# Altium footprint library FootprintSMD.PcbLib: 140 footprints (part 4 of 9)
Each footprint in its own frame and in the unit in brackets; x right, y up, seen from the top. Pads: shape width x height; smd on the part's side, far side on the other; paste and mask are expansions set on the pad; w line width, h text height; cw(c..) or ccw(c..) is an arc to the next point about the centre after c.
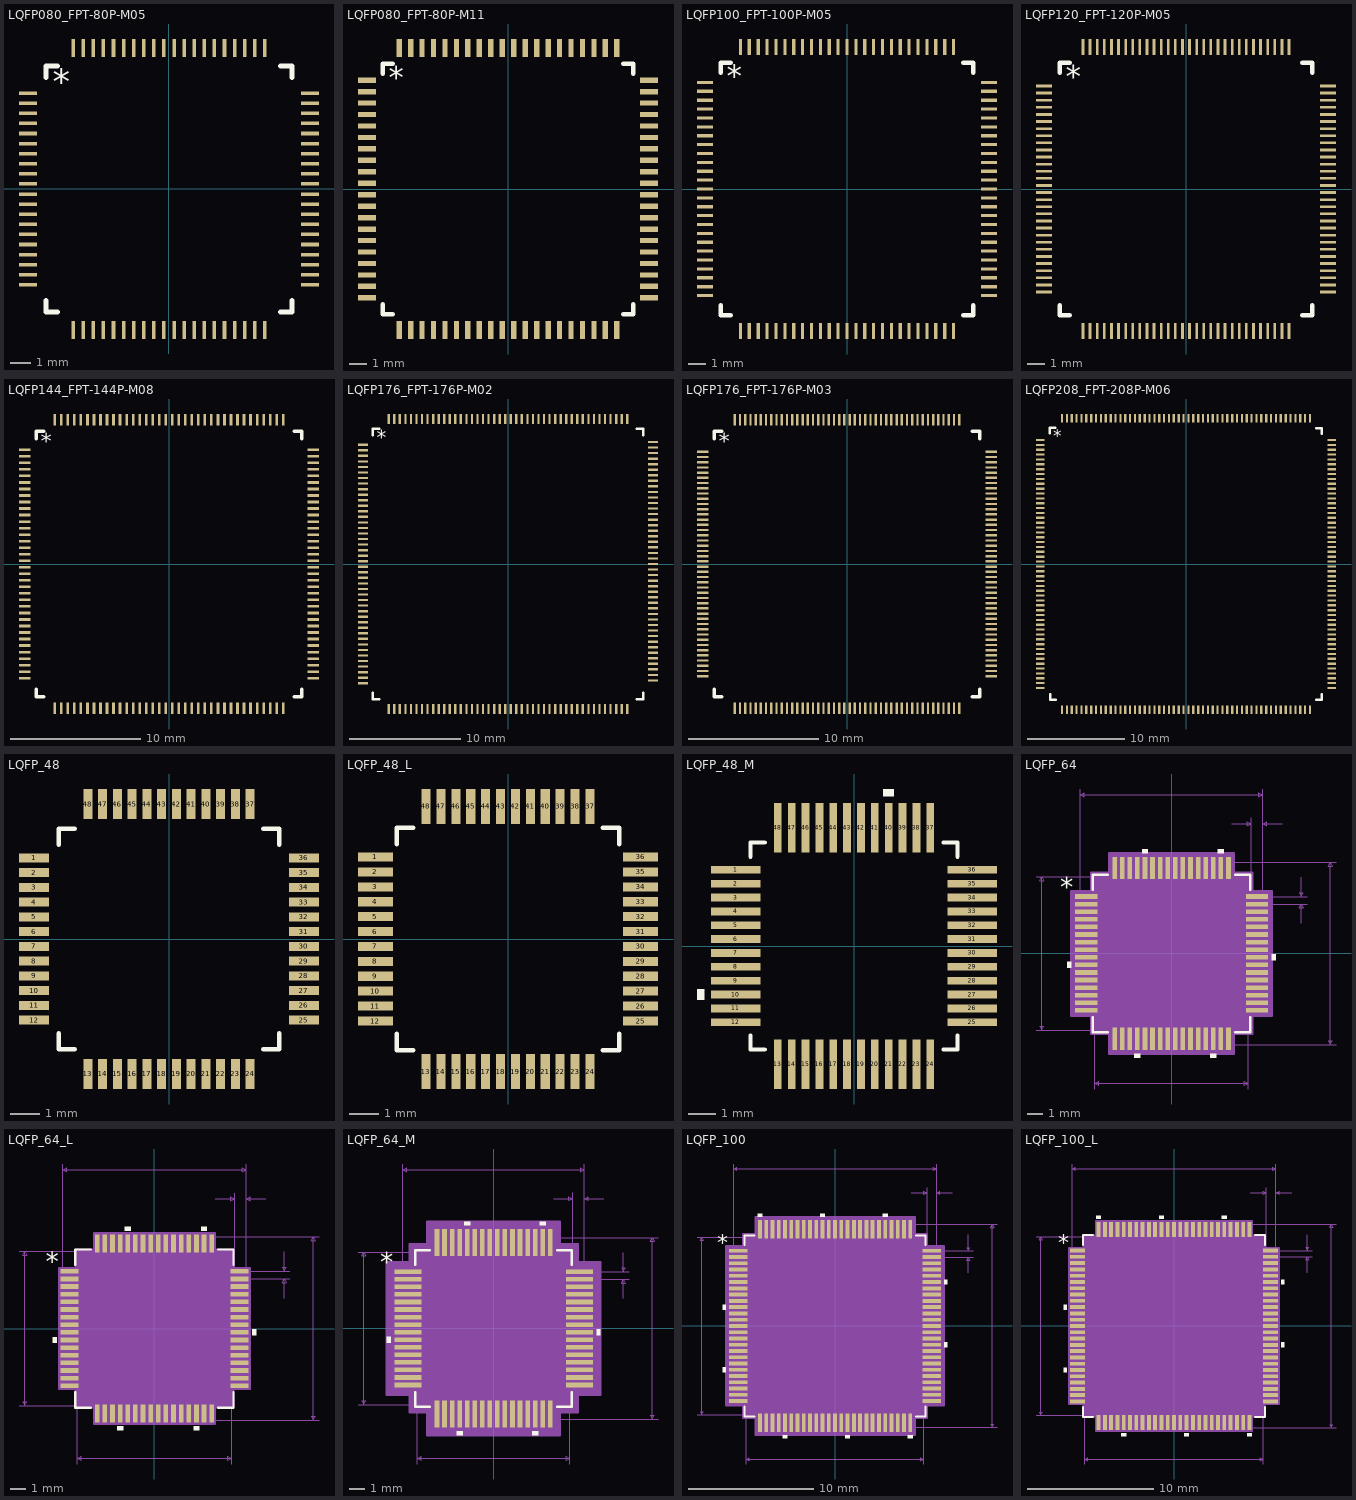
[diagram p3: the footprints below, top view; thin cyan lines are the x and y axes]

## LQFP080_FPT-80P-M05 [mil]
pads (80):
  rect 35x7 smd: 1(-275,187.01) 2(-275,167.32) 3(-275,147.64) 4(-275,127.95) 5(-275,108.27) 6(-275,88.58) 7(-275,68.9) 8(-275,49.21) 9(-275,29.53) 10(-275,9.84) 11(-275,-9.84) 12(-275,-29.53) 13(-275,-49.21) 14(-275,-68.9) 15(-275,-88.58) 16(-275,-108.27) 17(-275,-127.95) 18(-275,-147.64) 19(-275,-167.32) 20(-275,-187.01) 41(275,-187.01) 42(275,-167.32) 43(275,-147.64) 44(275,-127.95) 45(275,-108.27) 46(275,-88.58) 47(275,-68.9) 48(275,-49.21) 49(275,-29.53) 50(275,-9.84) 51(275,9.84) 52(275,29.53) 53(275,49.21) 54(275,68.9) 55(275,88.58) 56(275,108.27) 57(275,127.95) 58(275,147.64) 59(275,167.32) 60(275,187.01)
  rect 7x35 smd: 21(-187.01,-275) 22(-167.32,-275) 23(-147.64,-275) 24(-127.95,-275) 25(-108.27,-275) 26(-88.58,-275) 27(-68.9,-275) 28(-49.21,-275) 29(-29.53,-275) 30(-9.84,-275) 31(9.84,-275) 32(29.53,-275) 33(49.21,-275) 34(68.9,-275) 35(88.58,-275) 36(108.27,-275) 37(127.95,-275) 38(147.64,-275) 39(167.32,-275) 40(187.01,-275) 61(187.01,275) 62(167.32,275) 63(147.64,275) 64(127.95,275) 65(108.27,275) 66(88.58,275) 67(68.9,275) 68(49.21,275) 69(29.53,275) 70(9.84,275) 71(-9.84,275) 72(-29.53,275) 73(-49.21,275) 74(-68.9,275) 75(-88.58,275) 76(-108.27,275) 77(-127.95,275) 78(-147.64,275) 79(-167.32,275) 80(-187.01,275)
Top Overlay:
  lines w10: -240,-217.87 -240,-240 -217.87,-240 ; -240,217.87 -240,240 -217.87,240 ; 217.87,-240 240,-240 240,-217.87 ; 217.87,240 240,240 240,217.87
  text "*" at -226.66,185.01 h50
3D body "LQFP80_FPT-80P-M05.stp": height 59.06, standoff 0, extent -275.58,-275.59 275.6,275.59

## LQFP080_FPT-80P-M11 [mil]
pads (80):
  rect 40x12 smd: 1(-315,243.11) 2(-315,217.52) 3(-315,191.93) 4(-315,166.34) 5(-315,140.75) 6(-315,115.16) 7(-315,89.57) 8(-315,63.98) 9(-315,38.39) 10(-315,12.8) 11(-315,-12.8) 12(-315,-38.39) 13(-315,-63.98) 14(-315,-89.57) 15(-315,-115.16) 16(-315,-140.75) 17(-315,-166.34) 18(-315,-191.93) 19(-315,-217.52) 20(-315,-243.11) 41(315,-243.11) 42(315,-217.52) 43(315,-191.93) 44(315,-166.34) 45(315,-140.75) 46(315,-115.16) 47(315,-89.57) 48(315,-63.98) 49(315,-38.39) 50(315,-12.8) 51(315,12.8) 52(315,38.39) 53(315,63.98) 54(315,89.57) 55(315,115.16) 56(315,140.75) 57(315,166.34) 58(315,191.93) 59(315,217.52) 60(315,243.11)
  rect 12x40 smd: 21(-243.11,-315) 22(-217.52,-315) 23(-191.93,-315) 24(-166.34,-315) 25(-140.75,-315) 26(-115.16,-315) 27(-89.57,-315) 28(-63.98,-315) 29(-38.39,-315) 30(-12.8,-315) 31(12.8,-315) 32(38.39,-315) 33(63.98,-315) 34(89.57,-315) 35(115.16,-315) 36(140.75,-315) 37(166.34,-315) 38(191.93,-315) 39(217.52,-315) 40(243.11,-315) 61(243.11,315) 62(217.52,315) 63(191.93,315) 64(166.34,315) 65(140.75,315) 66(115.16,315) 67(89.57,315) 68(63.98,315) 69(38.39,315) 70(12.8,315) 71(-12.8,315) 72(-38.39,315) 73(-63.98,315) 74(-89.57,315) 75(-115.16,315) 76(-140.75,315) 77(-166.34,315) 78(-191.93,315) 79(-217.52,315) 80(-243.11,315)
Top Overlay:
  lines w10: -280,-257.87 -280,-280 -257.87,-280 ; -280,257.87 -280,280 -257.87,280 ; 257.87,-280 280,-280 280,-257.87 ; 257.87,280 280,280 280,257.87
  text "*" at -266.66,225.01 h50
3D body "LQFP80_FPT-80P-M11.stp": height 59.06, standoff 0, extent -314.95,-314.96 314.97,314.96

## LQFP100_FPT-100P-M05 [mil]
pads (100):
  rect 35x7 smd: 1(-315,236.22) 2(-315,216.54) 3(-315,196.85) 4(-315,177.17) 5(-315,157.48) 6(-315,137.8) 7(-315,118.11) 8(-315,98.43) 9(-315,78.74) 10(-315,59.06) 11(-315,39.37) 12(-315,19.68) 13(-315,0) 14(-315,-19.69) 15(-315,-39.37) 16(-315,-59.06) 17(-315,-78.74) 18(-315,-98.43) 19(-315,-118.11) 20(-315,-137.8) 21(-315,-157.48) 22(-315,-177.17) 23(-315,-196.85) 24(-315,-216.54) 25(-315,-236.22) 51(315,-236.22) 52(315,-216.54) 53(315,-196.85) 54(315,-177.17) 55(315,-157.48) 56(315,-137.8) 57(315,-118.11) 58(315,-98.43) 59(315,-78.74) 60(315,-59.06) 61(315,-39.37) 62(315,-19.69) 63(315,0) 64(315,19.68) 65(315,39.37) 66(315,59.06) 67(315,78.74) 68(315,98.43) 69(315,118.11) 70(315,137.8) 71(315,157.48) 72(315,177.17) 73(315,196.85) 74(315,216.54) 75(315,236.22)
  rect 7x35 smd: 26(-236.22,-315) 27(-216.54,-315) 28(-196.85,-315) 29(-177.17,-315) 30(-157.48,-315) 31(-137.8,-315) 32(-118.11,-315) 33(-98.43,-315) 34(-78.74,-315) 35(-59.06,-315) 36(-39.37,-315) 37(-19.69,-315) 38(0,-315) 39(19.68,-315) 40(39.37,-315) 41(59.06,-315) 42(78.74,-315) 43(98.43,-315) 44(118.11,-315) 45(137.8,-315) 46(157.48,-315) 47(177.17,-315) 48(196.85,-315) 49(216.54,-315) 50(236.22,-315) 76(236.22,315) 77(216.54,315) 78(196.85,315) 79(177.17,315) 80(157.48,315) 81(137.8,315) 82(118.11,315) 83(98.43,315) 84(78.74,315) 85(59.06,315) 86(39.37,315) 87(19.68,315) 88(0,315) 89(-19.69,315) 90(-39.37,315) 91(-59.06,315) 92(-78.74,315) 93(-98.43,315) 94(-118.11,315) 95(-137.8,315) 96(-157.48,315) 97(-177.17,315) 98(-196.85,315) 99(-216.54,315) 100(-236.22,315)
Top Overlay:
  lines w10: -280,-257.87 -280,-280 -257.87,-280 ; -280,257.87 -280,280 -257.87,280 ; 257.87,-280 280,-280 280,-257.87 ; 257.87,280 280,280 280,257.87
  text "*" at -266.66,225.01 h50
3D body "LQFP100_FPT-100P-M05.stp": height 59.06, standoff 0, extent -320,-309.92 309.92,320

## LQFP120_FPT-120P-M05 [mil]
pads (120):
  rect 35x6 smd: 1(-315,228.35) 2(-315,212.6) 3(-315,196.85) 4(-315,181.1) 5(-315,165.35) 6(-315,149.61) 7(-315,133.86) 8(-315,118.11) 9(-315,102.36) 10(-315,86.61) 11(-315,70.87) 12(-315,55.12) 13(-315,39.37) 14(-315,23.62) 15(-315,7.87) 16(-315,-7.87) 17(-315,-23.62) 18(-315,-39.37) 19(-315,-55.12) 20(-315,-70.87) 21(-315,-86.61) 22(-315,-102.36) 23(-315,-118.11) 24(-315,-133.86) 25(-315,-149.61) 26(-315,-165.35) 27(-315,-181.1) 28(-315,-196.85) 29(-315,-212.6) 30(-315,-228.35) 61(315,-228.35) 62(315,-212.6) 63(315,-196.85) 64(315,-181.1) 65(315,-165.35) 66(315,-149.61) 67(315,-133.86) 68(315,-118.11) 69(315,-102.36) 70(315,-86.61) 71(315,-70.87) 72(315,-55.12) 73(315,-39.37) 74(315,-23.62) 75(315,-7.87) 76(315,7.87) 77(315,23.62) 78(315,39.37) 79(315,55.12) 80(315,70.87) 81(315,86.61) 82(315,102.36) 83(315,118.11) 84(315,133.86) 85(315,149.61) 86(315,165.35) 87(315,181.1) 88(315,196.85) 89(315,212.6) 90(315,228.35)
  rect 6x35 smd: 31(-228.35,-315) 32(-212.6,-315) 33(-196.85,-315) 34(-181.1,-315) 35(-165.35,-315) 36(-149.61,-315) 37(-133.86,-315) 38(-118.11,-315) 39(-102.36,-315) 40(-86.61,-315) 41(-70.87,-315) 42(-55.12,-315) 43(-39.37,-315) 44(-23.62,-315) 45(-7.87,-315) 46(7.87,-315) 47(23.62,-315) 48(39.37,-315) 49(55.12,-315) 50(70.87,-315) 51(86.61,-315) 52(102.36,-315) 53(118.11,-315) 54(133.86,-315) 55(149.61,-315) 56(165.35,-315) 57(181.1,-315) 58(196.85,-315) 59(212.6,-315) 60(228.35,-315) 91(228.34,315) 92(212.59,315) 93(196.84,315) 94(181.1,315) 95(165.35,315) 96(149.6,315) 97(133.85,315) 98(118.1,315) 99(102.36,315) 100(86.61,315) 101(70.86,315) 102(55.11,315) 103(39.36,315) 104(23.62,315) 105(7.87,315) 106(-7.88,315) 107(-23.63,315) 108(-39.38,315) 109(-55.12,315) 110(-70.87,315) 111(-86.62,315) 112(-102.37,315) 113(-118.12,315) 114(-133.87,315) 115(-149.61,315) 116(-165.36,315) 117(-181.11,315) 118(-196.86,315) 119(-212.61,315) 120(-228.35,315)
Top Overlay:
  lines w10: -280,-257.87 -280,-280 -257.87,-280 ; -280,257.87 -280,280 -257.87,280 ; 257.87,-280 280,-280 280,-257.87 ; 257.87,280 280,280 280,257.87
  text "*" at -266.86,224.98 h50
3D body "LQFP120_FPT-120P-M05.stp": height 59.06, standoff 0, extent -314.95,-314.96 314.97,314.96

## LQFP144_FPT-144P-M08 [mil]
pads (144):
  rect 35x8 smd: 1(-435,344.49) 2(-435,324.8) 3(-435,305.12) 4(-435,285.43) 5(-435,265.75) 6(-435,246.06) 7(-435,226.38) 8(-435,206.69) 9(-435,187.01) 10(-435,167.32) 11(-435,147.64) 12(-435,127.95) 13(-435,108.27) 14(-435,88.58) 15(-435,68.9) 16(-435,49.21) 17(-435,29.53) 18(-435,9.84) 19(-435,-9.84) 20(-435,-29.53) 21(-435,-49.21) 22(-435,-68.9) 23(-435,-88.58) 24(-435,-108.27) 25(-435,-127.95) 26(-435,-147.64) 27(-435,-167.32) 28(-435,-187.01) 29(-435,-206.69) 30(-435,-226.38) 31(-435,-246.06) 32(-435,-265.75) 33(-435,-285.43) 34(-435,-305.12) 35(-435,-324.8) 36(-435,-344.49) 73(435,-344.49) 74(435,-324.8) 75(435,-305.12) 76(435,-285.43) 77(435,-265.75) 78(435,-246.06) 79(435,-226.38) 80(435,-206.69) 81(435,-187.01) 82(435,-167.32) 83(435,-147.64) 84(435,-127.95) 85(435,-108.27) 86(435,-88.58) 87(435,-68.9) 88(435,-49.21) 89(435,-29.53) 90(435,-9.84) 91(435,9.84) 92(435,29.53) 93(435,49.21) 94(435,68.9) 95(435,88.58) 96(435,108.27) 97(435,127.95) 98(435,147.64) 99(435,167.32) 100(435,187.01) 101(435,206.69) 102(435,226.38) 103(435,246.06) 104(435,265.75) 105(435,285.43) 106(435,305.12) 107(435,324.8) 108(435,344.49)
  rect 8x35 smd: 37(-344.49,-435) 38(-324.8,-435) 39(-305.12,-435) 40(-285.43,-435) 41(-265.75,-435) 42(-246.06,-435) 43(-226.38,-435) 44(-206.69,-435) 45(-187.01,-435) 46(-167.32,-435) 47(-147.64,-435) 48(-127.95,-435) 49(-108.27,-435) 50(-88.58,-435) 51(-68.9,-435) 52(-49.21,-435) 53(-29.53,-435) 54(-9.84,-435) 55(9.84,-435) 56(29.53,-435) 57(49.21,-435) 58(68.9,-435) 59(88.58,-435) 60(108.27,-435) 61(127.95,-435) 62(147.64,-435) 63(167.32,-435) 64(187.01,-435) 65(206.69,-435) 66(226.38,-435) 67(246.06,-435) 68(265.75,-435) 69(285.43,-435) 70(305.12,-435) 71(324.8,-435) 72(344.49,-435) 109(344.49,435) 110(324.8,435) 111(305.12,435) 112(285.43,435) 113(265.75,435) 114(246.06,435) 115(226.38,435) 116(206.69,435) 117(187.01,435) 118(167.32,435) 119(147.64,435) 120(127.95,435) 121(108.27,435) 122(88.58,435) 123(68.9,435) 124(49.21,435) 125(29.53,435) 126(9.84,435) 127(-9.84,435) 128(-29.53,435) 129(-49.21,435) 130(-68.9,435) 131(-88.58,435) 132(-108.27,435) 133(-127.95,435) 134(-147.64,435) 135(-167.32,435) 136(-187.01,435) 137(-206.69,435) 138(-226.38,435) 139(-246.06,435) 140(-265.75,435) 141(-285.43,435) 142(-305.12,435) 143(-324.8,435) 144(-344.49,435)
Top Overlay:
  lines w10: -400,-377.87 -400,-400 -377.87,-400 ; -400,377.87 -400,400 -377.87,400 ; 377.87,-400 400,-400 400,-377.87 ; 377.87,400 400,400 400,377.87
  text "*" at -386.86,344.98 h50
3D body "LQFP144_FPT-144P-M08.stp": height 66.93, standoff 0, extent -433.06,-433.07 433.08,433.07

## LQFP176_FPT-176P-M02 [mil]
pads (176):
  rect 35x8 smd: 1(-515,423.23) 2(-515,403.54) 3(-515,383.86) 4(-515,364.17) 5(-515,344.49) 6(-515,324.8) 7(-515,305.12) 8(-515,285.43) 9(-515,265.75) 10(-515,246.06) 11(-515,226.38) 12(-515,206.69) 13(-515,187.01) 14(-515,167.32) 15(-515,147.64) 16(-515,127.95) 17(-515,108.27) 18(-515,88.58) 19(-515,68.9) 20(-515,49.21) 21(-515,29.53) 22(-515,9.84) 23(-515,-9.84) 24(-515,-29.53) 25(-515,-49.21) 26(-515,-68.9) 27(-515,-88.58) 28(-515,-108.27) 29(-515,-127.95) 30(-515,-147.64) 31(-515,-167.32) 32(-515,-187.01) 33(-515,-206.69) 34(-515,-226.38) 35(-515,-246.06) 36(-515,-265.75) 37(-515,-285.43) 38(-515,-305.12) 39(-515,-324.8) 40(-515,-344.49) 41(-515,-364.17) 42(-515,-383.86) 43(-515,-403.54) 44(-515,-423.23) 89(515,-413.39) 90(515,-393.7) 91(515,-374.02) 92(515,-354.33) 93(515,-334.65) 94(515,-314.96) 95(515,-295.28) 96(515,-275.59) 97(515,-255.91) 98(515,-236.22) 99(515,-216.54) 100(515,-196.85) 101(515,-177.17) 102(515,-157.48) 103(515,-137.8) 104(515,-118.11) 105(515,-98.43) 106(515,-78.74) 107(515,-59.05) 108(515,-39.37) 109(515,-19.68) 110(515,0) 111(515,19.69) 112(515,39.37) 113(515,59.06) 114(515,78.74) 115(515,98.43) 116(515,118.11) 117(515,137.8) 118(515,157.48) 119(515,177.17) 120(515,196.85) 121(515,216.54) 122(515,236.22) 123(515,255.91) 124(515,275.59) 125(515,295.28) 126(515,314.96) 127(515,334.65) 128(515,354.33) 129(515,374.02) 130(515,393.7) 131(515,413.39) 132(515,433.07)
  rect 8x35 smd: 45(-423.23,-515) 46(-403.54,-515) 47(-383.86,-515) 48(-364.17,-515) 49(-344.49,-515) 50(-324.8,-515) 51(-305.12,-515) 52(-285.43,-515) 53(-265.75,-515) 54(-246.06,-515) 55(-226.38,-515) 56(-206.69,-515) 57(-187.01,-515) 58(-167.32,-515) 59(-147.64,-515) 60(-127.95,-515) 61(-108.27,-515) 62(-88.58,-515) 63(-68.9,-515) 64(-49.21,-515) 65(-29.53,-515) 66(-9.84,-515) 67(9.84,-515) 68(29.53,-515) 69(49.21,-515) 70(68.9,-515) 71(88.58,-515) 72(108.27,-515) 73(127.95,-515) 74(147.64,-515) 75(167.32,-515) 76(187.01,-515) 77(206.69,-515) 78(226.38,-515) 79(246.06,-515) 80(265.75,-515) 81(285.43,-515) 82(305.12,-515) 83(324.8,-515) 84(344.49,-515) 85(364.17,-515) 86(383.86,-515) 87(403.54,-515) 88(423.23,-515) 133(423.23,515) 134(403.54,515) 135(383.86,515) 136(364.17,515) 137(344.49,515) 138(324.8,515) 139(305.12,515) 140(285.43,515) 141(265.75,515) 142(246.06,515) 143(226.38,515) 144(206.69,515) 145(187.01,515) 146(167.32,515) 147(147.64,515) 148(127.95,515) 149(108.27,515) 150(88.58,515) 151(68.9,515) 152(49.21,515) 153(29.53,515) 154(9.84,515) 155(-9.84,515) 156(-29.53,515) 157(-49.21,515) 158(-68.9,515) 159(-88.58,515) 160(-108.27,515) 161(-127.95,515) 162(-147.64,515) 163(-167.32,515) 164(-187.01,515) 165(-206.69,515) 166(-226.38,515) 167(-246.06,515) 168(-265.75,515) 169(-285.43,515) 170(-305.12,515) 171(-324.8,515) 172(-344.49,515) 173(-364.17,515) 174(-383.86,515) 175(-403.54,515) 176(-423.23,515)
Top Overlay:
  lines w10: -480,-457.87 -480,-480 -457.87,-480 ; -480,457.87 -480,480 -457.87,480 ; 457.87,-480 480,-480 480,-457.87 ; 457.87,480 480,480 480,457.87
  text "*" at -466.66,425.01 h50
3D body "LQFP176_FPT-176P-M02.stp": height 59.06, standoff 0, extent -511.8,-511.81 511.82,511.81

## LQFP176_FPT-176P-M03 [mil]
pads (176):
  rect 35x7 smd: 1(-435,338.58) 2(-435,322.83) 3(-435,307.09) 4(-435,291.34) 5(-435,275.59) 6(-435,259.84) 7(-435,244.09) 8(-435,228.35) 9(-435,212.6) 10(-435,196.85) 11(-435,181.1) 12(-435,165.35) 13(-435,149.61) 14(-435,133.86) 15(-435,118.11) 16(-435,102.36) 17(-435,86.61) 18(-435,70.87) 19(-435,55.12) 20(-435,39.37) 21(-435,23.62) 22(-435,7.87) 23(-435,-7.87) 24(-435,-23.62) 25(-435,-39.37) 26(-435,-55.12) 27(-435,-70.87) 28(-435,-86.61) 29(-435,-102.36) 30(-435,-118.11) 31(-435,-133.86) 32(-435,-149.61) 33(-435,-165.35) 34(-435,-181.1) 35(-435,-196.85) 36(-435,-212.6) 37(-435,-228.35) 38(-435,-244.09) 39(-435,-259.84) 40(-435,-275.59) 41(-435,-291.34) 42(-435,-307.09) 43(-435,-322.83) 44(-435,-338.58) 89(435,-338.58) 90(435,-322.83) 91(435,-307.09) 92(435,-291.34) 93(435,-275.59) 94(435,-259.84) 95(435,-244.09) 96(435,-228.35) 97(435,-212.6) 98(435,-196.85) 99(435,-181.1) 100(435,-165.35) 101(435,-149.61) 102(435,-133.86) 103(435,-118.11) 104(435,-102.36) 105(435,-86.61) 106(435,-70.87) 107(435,-55.12) 108(435,-39.37) 109(435,-23.62) 110(435,-7.87) 111(435,7.87) 112(435,23.62) 113(435,39.37) 114(435,55.12) 115(435,70.87) 116(435,86.61) 117(435,102.36) 118(435,118.11) 119(435,133.86) 120(435,149.61) 121(435,165.35) 122(435,181.1) 123(435,196.85) 124(435,212.6) 125(435,228.35) 126(435,244.09) 127(435,259.84) 128(435,275.59) 129(435,291.34) 130(435,307.09) 131(435,322.83) 132(435,338.58)
  rect 7x35 smd: 45(-338.58,-435) 46(-322.83,-435) 47(-307.09,-435) 48(-291.34,-435) 49(-275.59,-435) 50(-259.84,-435) 51(-244.09,-435) 52(-228.35,-435) 53(-212.6,-435) 54(-196.85,-435) 55(-181.1,-435) 56(-165.35,-435) 57(-149.61,-435) 58(-133.86,-435) 59(-118.11,-435) 60(-102.36,-435) 61(-86.61,-435) 62(-70.87,-435) 63(-55.12,-435) 64(-39.37,-435) 65(-23.62,-435) 66(-7.87,-435) 67(7.87,-435) 68(23.62,-435) 69(39.37,-435) 70(55.12,-435) 71(70.87,-435) 72(86.61,-435) 73(102.36,-435) 74(118.11,-435) 75(133.86,-435) 76(149.61,-435) 77(165.35,-435) 78(181.1,-435) 79(196.85,-435) 80(212.6,-435) 81(228.35,-435) 82(244.09,-435) 83(259.84,-435) 84(275.59,-435) 85(291.34,-435) 86(307.09,-435) 87(322.83,-435) 88(338.58,-435) 133(338.58,435) 134(322.83,435) 135(307.09,435) 136(291.34,435) 137(275.59,435) 138(259.84,435) 139(244.09,435) 140(228.35,435) 141(212.6,435) 142(196.85,435) 143(181.1,435) 144(165.35,435) 145(149.61,435) 146(133.86,435) 147(118.11,435) 148(102.36,435) 149(86.61,435) 150(70.87,435) 151(55.12,435) 152(39.37,435) 153(23.62,435) 154(7.87,435) 155(-7.87,435) 156(-23.62,435) 157(-39.37,435) 158(-55.12,435) 159(-70.87,435) 160(-86.61,435) 161(-102.36,435) 162(-118.11,435) 163(-133.86,435) 164(-149.61,435) 165(-165.35,435) 166(-181.1,435) 167(-196.85,435) 168(-212.6,435) 169(-228.35,435) 170(-244.09,435) 171(-259.84,435) 172(-275.59,435) 173(-291.34,435) 174(-307.09,435) 175(-322.83,435) 176(-338.58,435)
Top Overlay:
  lines w10: -400,-377.87 -400,-400 -377.87,-400 ; -400,377.87 -400,400 -377.87,400 ; 377.87,-400 400,-400 400,-377.87 ; 377.87,400 400,400 400,377.87
  text "*" at -386.66,345.01 h50
3D body "LQFP176_FPT-176P-M03.stp": height 66.93, standoff 0, extent -433.07,-433.07 433.08,433.07

## LQFP208_FPT-208P-M06 [mil]
pads (208):
  rect 35x9 smd: 1(-590,501.97) 2(-590,482.28) 3(-590,462.6) 4(-590,442.91) 5(-590,423.23) 6(-590,403.54) 7(-590,383.86) 8(-590,364.17) 9(-590,344.49) 10(-590,324.8) 11(-590,305.12) 12(-590,285.43) 13(-590,265.75) 14(-590,246.06) 15(-590,226.38) 16(-590,206.69) 17(-590,187.01) 18(-590,167.32) 19(-590,147.64) 20(-590,127.95) 21(-590,108.27) 22(-590,88.58) 23(-590,68.9) 24(-590,49.21) 25(-590,29.53) 26(-590,9.84) 27(-590,-9.84) 28(-590,-29.53) 29(-590,-49.21) 30(-590,-68.9) 31(-590,-88.58) 32(-590,-108.27) 33(-590,-127.95) 34(-590,-147.64) 35(-590,-167.32) 36(-590,-187.01) 37(-590,-206.69) 38(-590,-226.38) 39(-590,-246.06) 40(-590,-265.75) 41(-590,-285.43) 42(-590,-305.12) 43(-590,-324.8) 44(-590,-344.49) 45(-590,-364.17) 46(-590,-383.86) 47(-590,-403.54) 48(-590,-423.23) 49(-590,-442.91) 50(-590,-462.6) 51(-590,-482.28) 52(-590,-501.97) 105(590,-501.97) 106(590,-482.28) 107(590,-462.6) 108(590,-442.91) 109(590,-423.23) 110(590,-403.54) 111(590,-383.86) 112(590,-364.17) 113(590,-344.49) 114(590,-324.8) 115(590,-305.12) 116(590,-285.43) 117(590,-265.75) 118(590,-246.06) 119(590,-226.38) 120(590,-206.69) 121(590,-187.01) 122(590,-167.32) 123(590,-147.64) 124(590,-127.95) 125(590,-108.27) 126(590,-88.58) 127(590,-68.9) 128(590,-49.21) 129(590,-29.53) 130(590,-9.84) 131(590,9.84) 132(590,29.53) 133(590,49.21) 134(590,68.9) 135(590,88.58) 136(590,108.27) 137(590,127.95) 138(590,147.64) 139(590,167.32) 140(590,187.01) 141(590,206.69) 142(590,226.38) 143(590,246.06) 144(590,265.75) 145(590,285.43) 146(590,305.12) 147(590,324.8) 148(590,344.49) 149(590,364.17) 150(590,383.86) 151(590,403.54) 152(590,423.23) 153(590,442.91) 154(590,462.6) 155(590,482.28) 156(590,501.97)
  rect 9x35 smd: 53(-501.97,-590) 54(-482.28,-590) 55(-462.6,-590) 56(-442.91,-590) 57(-423.23,-590) 58(-403.54,-590) 59(-383.86,-590) 60(-364.17,-590) 61(-344.49,-590) 62(-324.8,-590) 63(-305.12,-590) 64(-285.43,-590) 65(-265.75,-590) 66(-246.06,-590) 67(-226.38,-590) 68(-206.69,-590) 69(-187.01,-590) 70(-167.32,-590) 71(-147.64,-590) 72(-127.95,-590) 73(-108.27,-590) 74(-88.58,-590) 75(-68.9,-590) 76(-49.21,-590) 77(-29.53,-590) 78(-9.84,-590) 79(9.84,-590) 80(29.53,-590) 81(49.21,-590) 82(68.9,-590) 83(88.58,-590) 84(108.27,-590) 85(127.95,-590) 86(147.64,-590) 87(167.32,-590) 88(187.01,-590) 89(206.69,-590) 90(226.38,-590) 91(246.06,-590) 92(265.75,-590) 93(285.43,-590) 94(305.12,-590) 95(324.8,-590) 96(344.49,-590) 97(364.17,-590) 98(383.86,-590) 99(403.54,-590) 100(423.23,-590) 101(442.91,-590) 102(462.6,-590) 103(482.28,-590) 104(501.97,-590) 157(501.97,590) 158(482.28,590) 159(462.6,590) 160(442.91,590) 161(423.23,590) 162(403.54,590) 163(383.86,590) 164(364.17,590) 165(344.49,590) 166(324.8,590) 167(305.12,590) 168(285.43,590) 169(265.75,590) 170(246.06,590) 171(226.38,590) 172(206.69,590) 173(187.01,590) 174(167.32,590) 175(147.64,590) 176(127.95,590) 177(108.27,590) 178(88.58,590) 179(68.9,590) 180(49.21,590) 181(29.53,590) 182(9.84,590) 183(-9.84,590) 184(-29.53,590) 185(-49.21,590) 186(-68.9,590) 187(-88.58,590) 188(-108.27,590) 189(-127.95,590) 190(-147.64,590) 191(-167.32,590) 192(-187.01,590) 193(-206.69,590) 194(-226.38,590) 195(-246.06,590) 196(-265.75,590) 197(-285.43,590) 198(-305.12,590) 199(-324.8,590) 200(-344.49,590) 201(-364.17,590) 202(-383.86,590) 203(-403.54,590) 204(-423.23,590) 205(-442.91,590) 206(-462.6,590) 207(-482.28,590) 208(-501.97,590)
Top Overlay:
  lines w10: -550.87,530.46 -550.87,552.59 -528.74,552.59 ; -550,-527.87 -550,-550 -527.87,-550 ; 527.87,-550 550,-550 550,-527.87 ; 527.87,550 550,550 550,527.87
  text "*" at -536.66,495.01 h50
3D body "LQFP208_FPT-208P-M06.stp": height 66.93, standoff 0, extent -590.54,-590.55 590.56,590.55

## LQFP_48 [mil]
pads (48):
  rect 40x12 smd paste+0 mask+0: 1(-180,108.27) 2(-180,88.58) 3(-180,68.9) 4(-180,49.21) 5(-180,29.53) 6(-180,9.84) 7(-180,-9.84) 8(-180,-29.53) 9(-180,-49.21) 10(-180,-68.9) 11(-180,-88.58) 12(-180,-108.27) 25(180,-108.27) 26(180,-88.58) 27(180,-68.9) 28(180,-49.21) 29(180,-29.53) 30(180,-9.84) 31(180,9.84) 32(180,29.53) 33(180,49.21) 34(180,68.9) 35(180,88.58) 36(180,108.27)
  rect 12x40 smd paste+0 mask+0: 13(-108.27,-180) 14(-88.58,-180) 15(-68.9,-180) 16(-49.21,-180) 17(-29.53,-180) 18(-9.84,-180) 19(9.84,-180) 20(29.53,-180) 21(49.21,-180) 22(68.9,-180) 23(88.58,-180) 24(108.27,-180) 37(108.27,180) 38(88.58,180) 39(68.9,180) 40(49.21,180) 41(29.53,180) 42(9.84,180) 43(-9.84,180) 44(-29.53,180) 45(-49.21,180) 46(-68.9,180) 47(-88.58,180) 48(-108.27,180)
Top Overlay:
  lines w6: -147,-125.87 -147,-147 -125.87,-147 ; -147,125.87 -147,147 -125.87,147 ; 125.87,-147 147,-147 147,-125.87 ; 125.87,147 147,147 147,125.87
3D body "LQFP-48.step": height 63.11, standoff 0, extent -180.98,-180.98 180.99,180.99

## LQFP_48_L [mil]
pads (48):
  rect 46x12 smd paste+0 mask+0: 1(-175,108.27) 2(-175,88.58) 3(-175,68.9) 4(-175,49.21) 5(-175,29.53) 6(-175,9.84) 7(-175,-9.84) 8(-175,-29.53) 9(-175,-49.21) 10(-175,-68.9) 11(-175,-88.58) 12(-175,-108.27) 25(175,-108.27) 26(175,-88.58) 27(175,-68.9) 28(175,-49.21) 29(175,-29.53) 30(175,-9.84) 31(175,9.84) 32(175,29.53) 33(175,49.21) 34(175,68.9) 35(175,88.58) 36(175,108.27)
  rect 12x46 smd paste+0 mask+0: 13(-108.27,-175) 14(-88.58,-175) 15(-68.9,-175) 16(-49.21,-175) 17(-29.53,-175) 18(-9.84,-175) 19(9.84,-175) 20(29.53,-175) 21(49.21,-175) 22(68.9,-175) 23(88.58,-175) 24(108.27,-175) 37(108.27,175) 38(88.58,175) 39(68.9,175) 40(49.21,175) 41(29.53,175) 42(9.84,175) 43(-9.84,175) 44(-29.53,175) 45(-49.21,175) 46(-68.9,175) 47(-88.58,175) 48(-108.27,175)
Top Overlay:
  lines w6: -147,-124.87 -147,-147 -124.87,-147 ; -147,124.87 -147,147 -124.87,147 ; 124.87,-147 147,-147 147,-124.87 ; 124.87,147 147,147 147,124.87
3D body "LQFP-48-L.step": height 63.11, standoff 0, extent -180.98,-180.98 180.99,180.99

## LQFP_48_M [mil]
pads (48):
  rect 70x11 smd paste+0 mask+0: 1(-168,108.27) 2(-168,88.58) 3(-168,68.9) 4(-168,49.21) 5(-168,29.53) 6(-168,9.84) 7(-168,-9.84) 8(-168,-29.53) 9(-168,-49.21) 10(-168,-68.9) 11(-168,-88.58) 12(-168,-108.27) 25(168,-108.27) 26(168,-88.58) 27(168,-68.9) 28(168,-49.21) 29(168,-29.53) 30(168,-9.84) 31(168,9.84) 32(168,29.53) 33(168,49.21) 34(168,68.9) 35(168,88.58) 36(168,108.27)
  rect 11x70 smd paste+0 mask+0: 13(-108.27,-168) 14(-88.58,-168) 15(-68.9,-168) 16(-49.21,-168) 17(-29.53,-168) 18(-9.84,-168) 19(9.84,-168) 20(29.53,-168) 21(49.21,-168) 22(68.9,-168) 23(88.58,-168) 24(108.27,-168) 37(108.27,168) 38(88.58,168) 39(68.9,168) 40(49.21,168) 41(29.53,168) 42(9.84,168) 43(-9.84,168) 44(-29.53,168) 45(-49.21,168) 46(-68.9,168) 47(-88.58,168) 48(-108.27,168)
Top Overlay:
  region: 56.71,213 41.71,213 41.71,223 56.71,223
  region: -213,-61.4 -223,-61.4 -223,-76.4 -213,-76.4
  lines w6: -147,-126.87 -147,-147 -126.87,-147 ; -147,126.87 -147,147 -126.87,147 ; 126.87,-147 147,-147 147,-126.87 ; 126.87,147 147,147 147,126.87
3D body: height 10, standoff 0, extent 0,0 10,10
3D body "LQFP-48-M.step": height 63.11, standoff 0, extent -180.98,-180.98 180.99,180.99

## LQFP_64 [mil]
pads (64):
  rect 58x12 smd paste+0 mask+0: 1(-221.5,147.64) 2(-221.5,127.95) 3(-221.5,108.27) 4(-221.5,88.58) 5(-221.5,68.9) 6(-221.5,49.21) 7(-221.5,29.53) 8(-221.5,9.84) 9(-221.5,-9.84) 10(-221.5,-29.53) 11(-221.5,-49.21) 12(-221.5,-68.9) 13(-221.5,-88.58) 14(-221.5,-108.27) 15(-221.5,-127.95) 16(-221.5,-147.64) 33(221.5,-147.64) 34(221.5,-127.95) 35(221.5,-108.27) 36(221.5,-88.58) 37(221.5,-68.9) 38(221.5,-49.21) 39(221.5,-29.53) 40(221.5,-9.84) 41(221.5,9.84) 42(221.5,29.53) 43(221.5,49.21) 44(221.5,68.9) 45(221.5,88.58) 46(221.5,108.27) 47(221.5,127.95) 48(221.5,147.64)
  rect 12x58 smd paste+0 mask+0: 17(-147.64,-221.5) 18(-127.95,-221.5) 19(-108.27,-221.5) 20(-88.58,-221.5) 21(-68.9,-221.5) 22(-49.21,-221.5) 23(-29.53,-221.5) 24(-9.84,-221.5) 25(9.84,-221.5) 26(29.53,-221.5) 27(49.21,-221.5) 28(68.9,-221.5) 29(88.58,-221.5) 30(108.27,-221.5) 31(127.95,-221.5) 32(147.64,-221.5) 49(147.64,221.5) 50(127.95,221.5) 51(108.27,221.5) 52(88.58,221.5) 53(68.9,221.5) 54(49.21,221.5) 55(29.53,221.5) 56(9.84,221.5) 57(-9.84,221.5) 58(-29.53,221.5) 59(-49.21,221.5) 60(-68.9,221.5) 61(-88.58,221.5) 62(-108.27,221.5) 63(-127.95,221.5) 64(-147.64,221.5)
Top Overlay:
  region: -61.4,260.5 -76.4,260.5 -76.4,270.5 -61.4,270.5
  region: 135.45,260.5 120.45,260.5 120.45,270.5 135.45,270.5
  region: 260.5,-2.34 270.5,-2.34 270.5,-17.34 260.5,-17.34
  region: 115.77,-260.5 100.77,-260.5 100.77,-270.5 115.77,-270.5
  region: -81.08,-260.5 -96.08,-260.5 -96.08,-270.5 -81.08,-270.5
  region: -260.5,-22.03 -270.5,-22.03 -270.5,-37.03 -260.5,-37.03
  lines w6: -204,-165.24 -204,-204 -165.24,-204 ; -204,165.24 -204,204 -165.24,204 ; 165.24,-204 204,-204 204,-165.24 ; 165.24,204 204,204 204,165.24
  text "*" at -288,147.48 h50
Mechanical 7:
  lines w1: -351.5,-199 -147.64,-199 ; -351.5,199 -147.64,199 ; -236.5,147.64 -236.5,426.5 ; -199,-351.5 -199,-147.64 ; 147.64,-236.5 426.5,-236.5 ; 147.64,236.5 426.5,236.5 ; 156.5,336.5 206.5,336.5 ; 199,-351.5 199,-147.64 ; 206.5,147.64 206.5,351.5 ; 221.5,127.95 351.5,127.95 ; 221.5,147.64 351.5,147.64 ; 236.5,351.5 236.5,147.64 236.5,426.5 ; 286.5,336.5 236.5,336.5 ; 336.5,77.95 336.5,127.95 ; 336.5,197.64 336.5,147.64 ; -336.5,-199 -331.5,-189 -341.5,-189 -336.5,-199 ; -336.5,-199 -336.5,199 ; -336.5,199 -331.5,189 -341.5,189 -336.5,199 ; -236.5,411.5 -226.5,406.5 -226.5,416.5 -236.5,411.5 ; -236.5,411.5 236.5,411.5 ; -199,-336.5 -189,-341.5 -189,-331.5 -199,-336.5 ; -199,-336.5 199,-336.5 ; 199,-336.5 189,-341.5 189,-331.5 199,-336.5 ; 206.5,336.5 196.5,331.5 196.5,341.5 206.5,336.5 ; 236.5,336.5 246.5,331.5 246.5,341.5 236.5,336.5 ; 236.5,411.5 226.5,406.5 226.5,416.5 236.5,411.5 ; 336.5,127.95 341.5,117.95 331.5,117.95 336.5,127.95 ; 336.5,147.64 341.5,157.64 331.5,157.64 336.5,147.64 ; 411.5,-236.5 416.5,-226.5 406.5,-226.5 411.5,-236.5 ; 411.5,-236.5 411.5,236.5 ; 411.5,236.5 416.5,226.5 406.5,226.5 411.5,236.5
  text "0.473in/12.014mm" at 431.5,-12.5 h25
  text "0.398in/10.109mm" at -556.5,-12.5 h25
  text "0.398in/10.109mm" at -100,-381.5 h25
  text "0.473in/12.014mm" at -100,431.5 h25
  text "0.03in/0.762mm" at 134,356.5 h25
  text "0.02in/0.5mm" at 356.5,125.3 h25
Mechanical 13:
  drawing of 261 lines, arcs and shapes, not listed
  text "*" at -196.5,132.48 h50
Mechanical 15:
  region: -162.14,-209 -209,-209 -209,-162.14 -260.5,-162.14 -260.5,162.14 -209,162.14 -209,209 -162.14,209 -162.14,260.5 162.14,260.5 162.14,209 209,209 209,162.14 260.5,162.14 260.5,-162.14 209,-162.14 209,-209 162.14,-209 162.14,-260.5 -162.14,-260.5
  lines w6: -260.5,-162.14 -260.5,162.14 -209,162.14 -209,209 -162.14,209 -162.14,260.5 162.14,260.5 162.14,209 209,209 209,162.14 260.5,162.14 260.5,-162.14 209,-162.14 209,-209 162.14,-209 162.14,-260.5 -162.14,-260.5 -162.14,-209 -209,-209 -209,-162.14 -260.5,-162.14
3D body: height 10, standoff 0, extent 0,0 10,10
3D body "LQFP-64.step": height 63.11, standoff 0, extent -236.49,-236.49 236.5,236.5

## LQFP_64_L [mil]
pads (64):
  rect 46x12 smd paste+0 mask+0: 1(-219.5,147.64) 2(-219.5,127.95) 3(-219.5,108.27) 4(-219.5,88.58) 5(-219.5,68.9) 6(-219.5,49.21) 7(-219.5,29.53) 8(-219.5,9.84) 9(-219.5,-9.84) 10(-219.5,-29.53) 11(-219.5,-49.21) 12(-219.5,-68.9) 13(-219.5,-88.58) 14(-219.5,-108.27) 15(-219.5,-127.95) 16(-219.5,-147.64) 33(219.5,-147.64) 34(219.5,-127.95) 35(219.5,-108.27) 36(219.5,-88.58) 37(219.5,-68.9) 38(219.5,-49.21) 39(219.5,-29.53) 40(219.5,-9.84) 41(219.5,9.84) 42(219.5,29.53) 43(219.5,49.21) 44(219.5,68.9) 45(219.5,88.58) 46(219.5,108.27) 47(219.5,127.95) 48(219.5,147.64)
  rect 12x46 smd paste+0 mask+0: 17(-147.64,-219.5) 18(-127.95,-219.5) 19(-108.27,-219.5) 20(-88.58,-219.5) 21(-68.9,-219.5) 22(-49.21,-219.5) 23(-29.53,-219.5) 24(-9.84,-219.5) 25(9.84,-219.5) 26(29.53,-219.5) 27(49.21,-219.5) 28(68.9,-219.5) 29(88.58,-219.5) 30(108.27,-219.5) 31(127.95,-219.5) 32(147.64,-219.5) 49(147.64,219.5) 50(127.95,219.5) 51(108.27,219.5) 52(88.58,219.5) 53(68.9,219.5) 54(49.21,219.5) 55(29.53,219.5) 56(9.84,219.5) 57(-9.84,219.5) 58(-29.53,219.5) 59(-49.21,219.5) 60(-68.9,219.5) 61(-88.58,219.5) 62(-108.27,219.5) 63(-127.95,219.5) 64(-147.64,219.5)
Top Overlay:
  region: -61.4,252.5 -76.4,252.5 -76.4,262.5 -61.4,262.5
  region: 135.45,252.5 120.45,252.5 120.45,262.5 135.45,262.5
  region: 252.5,-2.34 262.5,-2.34 262.5,-17.34 252.5,-17.34
  region: 115.77,-252.5 100.77,-252.5 100.77,-262.5 115.77,-262.5
  region: -81.08,-252.5 -96.08,-252.5 -96.08,-262.5 -81.08,-262.5
  region: -252.5,-22.03 -262.5,-22.03 -262.5,-37.03 -252.5,-37.03
  lines w6: -204,-164.24 -204,-204 -164.24,-204 ; -204,164.24 -204,204 -164.24,204 ; 164.24,-204 204,-204 204,-164.24 ; 164.24,204 204,204 204,164.24
  text "*" at -280,147.48 h50
Mechanical 7:
  lines w1: -349.5,-199 -147.64,-199 ; -349.5,199 -147.64,199 ; -236.5,147.64 -236.5,424.5 ; -199,-349.5 -199,-147.64 ; 147.64,-236.5 424.5,-236.5 ; 147.64,236.5 424.5,236.5 ; 156.5,334.5 206.5,334.5 ; 199,-349.5 199,-147.64 ; 206.5,147.64 206.5,349.5 ; 219.5,127.95 349.5,127.95 ; 219.5,147.64 349.5,147.64 ; 236.5,349.5 236.5,147.64 236.5,424.5 ; 286.5,334.5 236.5,334.5 ; 334.5,77.95 334.5,127.95 ; 334.5,197.64 334.5,147.64 ; -334.5,-199 -329.5,-189 -339.5,-189 -334.5,-199 ; -334.5,-199 -334.5,199 ; -334.5,199 -329.5,189 -339.5,189 -334.5,199 ; -236.5,409.5 -226.5,404.5 -226.5,414.5 -236.5,409.5 ; -236.5,409.5 236.5,409.5 ; -199,-334.5 -189,-339.5 -189,-329.5 -199,-334.5 ; -199,-334.5 199,-334.5 ; 199,-334.5 189,-339.5 189,-329.5 199,-334.5 ; 206.5,334.5 196.5,329.5 196.5,339.5 206.5,334.5 ; 236.5,334.5 246.5,329.5 246.5,339.5 236.5,334.5 ; 236.5,409.5 226.5,404.5 226.5,414.5 236.5,409.5 ; 334.5,127.95 339.5,117.95 329.5,117.95 334.5,127.95 ; 334.5,147.64 339.5,157.64 329.5,157.64 334.5,147.64 ; 409.5,-236.5 414.5,-226.5 404.5,-226.5 409.5,-236.5 ; 409.5,-236.5 409.5,236.5 ; 409.5,236.5 414.5,226.5 404.5,226.5 409.5,236.5
  text "0.473in/12.014mm" at 429.5,-12.5 h25
  text "0.398in/10.109mm" at -554.5,-12.5 h25
  text "0.398in/10.109mm" at -100,-379.5 h25
  text "0.473in/12.014mm" at -100,429.5 h25
  text "0.03in/0.762mm" at 134,354.5 h25
  text "0.02in/0.5mm" at 354.5,125.3 h25
Mechanical 13:
  drawing of 261 lines, arcs and shapes, not listed
  text "*" at -196.5,132.48 h50
Mechanical 15:
  region: -155.14,-203 -203,-203 -203,-155.14 -246.5,-155.14 -246.5,155.14 -203,155.14 -203,203 -155.14,203 -155.14,246.5 155.14,246.5 155.14,203 203,203 203,155.14 246.5,155.14 246.5,-155.14 203,-155.14 203,-203 155.14,-203 155.14,-246.5 -155.14,-246.5
  lines w6: -246.5,-155.14 -246.5,155.14 -203,155.14 -203,203 -155.14,203 -155.14,246.5 155.14,246.5 155.14,203 203,203 203,155.14 246.5,155.14 246.5,-155.14 203,-155.14 203,-203 155.14,-203 155.14,-246.5 -155.14,-246.5 -155.14,-203 -203,-203 -203,-155.14 -246.5,-155.14
3D body: height 10, standoff 0, extent 0,0 10,10
3D body "LQFP-64-L.step": height 63.11, standoff 0, extent -236.49,-236.49 236.5,236.5

## LQFP_64_M [mil]
pads (64):
  rect 70x12 smd paste+0 mask+0: 1(-223.5,147.64) 2(-223.5,127.95) 3(-223.5,108.27) 4(-223.5,88.58) 5(-223.5,68.9) 6(-223.5,49.21) 7(-223.5,29.53) 8(-223.5,9.84) 9(-223.5,-9.84) 10(-223.5,-29.53) 11(-223.5,-49.21) 12(-223.5,-68.9) 13(-223.5,-88.58) 14(-223.5,-108.27) 15(-223.5,-127.95) 16(-223.5,-147.64) 33(223.5,-147.64) 34(223.5,-127.95) 35(223.5,-108.27) 36(223.5,-88.58) 37(223.5,-68.9) 38(223.5,-49.21) 39(223.5,-29.53) 40(223.5,-9.84) 41(223.5,9.84) 42(223.5,29.53) 43(223.5,49.21) 44(223.5,68.9) 45(223.5,88.58) 46(223.5,108.27) 47(223.5,127.95) 48(223.5,147.64)
  rect 12x70 smd paste+0 mask+0: 17(-147.64,-223.5) 18(-127.95,-223.5) 19(-108.27,-223.5) 20(-88.58,-223.5) 21(-68.9,-223.5) 22(-49.21,-223.5) 23(-29.53,-223.5) 24(-9.84,-223.5) 25(9.84,-223.5) 26(29.53,-223.5) 27(49.21,-223.5) 28(68.9,-223.5) 29(88.58,-223.5) 30(108.27,-223.5) 31(127.95,-223.5) 32(147.64,-223.5) 49(147.64,223.5) 50(127.95,223.5) 51(108.27,223.5) 52(88.58,223.5) 53(68.9,223.5) 54(49.21,223.5) 55(29.53,223.5) 56(9.84,223.5) 57(-9.84,223.5) 58(-29.53,223.5) 59(-49.21,223.5) 60(-68.9,223.5) 61(-88.58,223.5) 62(-108.27,223.5) 63(-127.95,223.5) 64(-147.64,223.5)
Top Overlay:
  region: -61.4,268.5 -76.4,268.5 -76.4,278.5 -61.4,278.5
  region: 135.45,268.5 120.45,268.5 120.45,278.5 135.45,278.5
  region: 268.5,-2.34 278.5,-2.34 278.5,-17.34 268.5,-17.34
  region: 115.77,-268.5 100.77,-268.5 100.77,-278.5 115.77,-278.5
  region: -81.08,-268.5 -96.08,-268.5 -96.08,-278.5 -81.08,-278.5
  region: -268.5,-22.03 -278.5,-22.03 -278.5,-37.03 -268.5,-37.03
  lines w6: -204,-166.24 -204,-204 -166.24,-204 ; -204,166.24 -204,204 -166.24,204 ; 166.24,-204 204,-204 204,-166.24 ; 166.24,204 204,204 204,166.24
  text "*" at -296,147.48 h50
Mechanical 7:
  lines w1: -353.5,-199 -147.64,-199 ; -353.5,199 -147.64,199 ; -236.5,147.64 -236.5,428.5 ; -199,-353.5 -199,-147.64 ; 147.64,-236.5 428.5,-236.5 ; 147.64,236.5 428.5,236.5 ; 156.5,338.5 206.5,338.5 ; 199,-353.5 199,-147.64 ; 206.5,147.64 206.5,353.5 ; 223.5,127.95 353.5,127.95 ; 223.5,147.64 353.5,147.64 ; 236.5,353.5 236.5,147.64 236.5,428.5 ; 286.5,338.5 236.5,338.5 ; 338.5,77.95 338.5,127.95 ; 338.5,197.64 338.5,147.64 ; -338.5,-199 -333.5,-189 -343.5,-189 -338.5,-199 ; -338.5,-199 -338.5,199 ; -338.5,199 -333.5,189 -343.5,189 -338.5,199 ; -236.5,413.5 -226.5,408.5 -226.5,418.5 -236.5,413.5 ; -236.5,413.5 236.5,413.5 ; -199,-338.5 -189,-343.5 -189,-333.5 -199,-338.5 ; -199,-338.5 199,-338.5 ; 199,-338.5 189,-343.5 189,-333.5 199,-338.5 ; 206.5,338.5 196.5,333.5 196.5,343.5 206.5,338.5 ; 236.5,338.5 246.5,333.5 246.5,343.5 236.5,338.5 ; 236.5,413.5 226.5,408.5 226.5,418.5 236.5,413.5 ; 338.5,127.95 343.5,117.95 333.5,117.95 338.5,127.95 ; 338.5,147.64 343.5,157.64 333.5,157.64 338.5,147.64 ; 413.5,-236.5 418.5,-226.5 408.5,-226.5 413.5,-236.5 ; 413.5,-236.5 413.5,236.5 ; 413.5,236.5 418.5,226.5 408.5,226.5 413.5,236.5
  text "0.473in/12.014mm" at 433.5,-12.5 h25
  text "0.398in/10.109mm" at -558.5,-12.5 h25
  text "0.398in/10.109mm" at -100,-383.5 h25
  text "0.473in/12.014mm" at -100,433.5 h25
  text "0.03in/0.762mm" at 134,358.5 h25
  text "0.02in/0.5mm" at 358.5,125.3 h25
Mechanical 13:
  drawing of 261 lines, arcs and shapes, not listed
  text "*" at -196.5,132.48 h50
Mechanical 15:
  region: -173.14,-219 -219,-219 -219,-173.14 -278.5,-173.14 -278.5,173.14 -219,173.14 -219,219 -173.14,219 -173.14,278.5 173.14,278.5 173.14,219 219,219 219,173.14 278.5,173.14 278.5,-173.14 219,-173.14 219,-219 173.14,-219 173.14,-278.5 -173.14,-278.5
  lines w6: -278.5,-173.14 -278.5,173.14 -219,173.14 -219,219 -173.14,219 -173.14,278.5 173.14,278.5 173.14,219 219,219 219,173.14 278.5,173.14 278.5,-173.14 219,-173.14 219,-219 173.14,-219 173.14,-278.5 -173.14,-278.5 -173.14,-219 -219,-219 -219,-173.14 -278.5,-173.14
3D body "LQFP-64-M.step": height 63.11, standoff 0, extent -236.49,-236.49 236.5,236.5
3D body: height 10, standoff 0, extent 0,0 10,10

## LQFP_100 [mil]
pads (100):
  rect 58x12 smd paste+0 mask+0: 1(-304,236.22) 2(-304,216.54) 3(-304,196.85) 4(-304,177.17) 5(-304,157.48) 6(-304,137.8) 7(-304,118.11) 8(-304,98.43) 9(-304,78.74) 10(-304,59.06) 11(-304,39.37) 12(-304,19.69) 13(-304,0) 14(-304,-19.68) 15(-304,-39.37) 16(-304,-59.06) 17(-304,-78.74) 18(-304,-98.43) 19(-304,-118.11) 20(-304,-137.8) 21(-304,-157.48) 22(-304,-177.17) 23(-304,-196.85) 24(-304,-216.54) 25(-304,-236.22) 51(304,-236.22) 52(304,-216.54) 53(304,-196.85) 54(304,-177.17) 55(304,-157.48) 56(304,-137.8) 57(304,-118.11) 58(304,-98.43) 59(304,-78.74) 60(304,-59.06) 61(304,-39.37) 62(304,-19.68) 63(304,0) 64(304,19.68) 65(304,39.37) 66(304,59.06) 67(304,78.74) 68(304,98.43) 69(304,118.11) 70(304,137.8) 71(304,157.48) 72(304,177.17) 73(304,196.85) 74(304,216.54) 75(304,236.22)
  rect 12x58 smd paste+0 mask+0: 26(-236.22,-304) 27(-216.54,-304) 28(-196.85,-304) 29(-177.17,-304) 30(-157.48,-304) 31(-137.8,-304) 32(-118.11,-304) 33(-98.43,-304) 34(-78.74,-304) 35(-59.06,-304) 36(-39.37,-304) 37(-19.68,-304) 38(0,-304) 39(19.68,-304) 40(39.37,-304) 41(59.06,-304) 42(78.74,-304) 43(98.43,-304) 44(118.11,-304) 45(137.8,-304) 46(157.48,-304) 47(177.17,-304) 48(196.85,-304) 49(216.54,-304) 50(236.22,-304) 76(236.22,304) 77(216.54,304) 78(196.85,304) 79(177.17,304) 80(157.48,304) 81(137.8,304) 82(118.11,304) 83(98.43,304) 84(78.74,304) 85(59.06,304) 86(39.37,304) 87(19.68,304) 88(0,304) 89(-19.68,304) 90(-39.37,304) 91(-59.06,304) 92(-78.74,304) 93(-98.43,304) 94(-118.11,304) 95(-137.8,304) 96(-157.48,304) 97(-177.17,304) 98(-196.85,304) 99(-216.54,304) 100(-236.22,304)
Top Overlay:
  region: -228.72,343 -243.72,343 -243.72,353 -228.72,353
  region: -31.87,343 -46.87,343 -46.87,353 -31.87,353
  region: 164.98,343 149.98,343 149.98,353 164.98,353
  region: 343,145.3 353,145.3 353,130.3 343,130.3
  region: 343,-51.56 353,-51.56 353,-66.56 343,-66.56
  region: 243.72,-343 228.72,-343 228.72,-353 243.72,-353
  region: 46.87,-343 31.87,-343 31.87,-353 46.87,-353
  region: -149.98,-343 -164.98,-343 -164.98,-353 -149.98,-353
  region: -343,-130.3 -353,-130.3 -353,-145.3 -343,-145.3
  region: -343,66.56 -353,66.56 -353,51.56 -343,51.56
  lines w6: -284.5,-253.82 -284.5,-284.5 -253.82,-284.5 ; -284.5,253.82 -284.5,284.5 -253.82,284.5 ; 253.82,-284.5 284.5,-284.5 284.5,-253.82 ; 253.82,284.5 284.5,284.5 284.5,253.82
  text "*" at -370.5,236.06 h50
Mechanical 7:
  lines w1: -434,-279.5 -236.22,-279.5 ; -434,279.5 -236.22,279.5 ; -319,236.22 -319,509 ; -279.5,-434 -279.5,-236.22 ; 236.22,-319 509,-319 ; 236.22,319 509,319 ; 239,419 289,419 ; 279.5,-434 279.5,-236.22 ; 289,236.22 289,434 ; 304,216.54 434,216.54 ; 304,236.22 434,236.22 ; 319,434 319,236.22 319,509 ; 369,419 319,419 ; 419,166.54 419,216.54 ; 419,286.22 419,236.22 ; -419,-279.5 -414,-269.5 -424,-269.5 -419,-279.5 ; -419,-279.5 -419,279.5 ; -419,279.5 -414,269.5 -424,269.5 -419,279.5 ; -319,494 -309,489 -309,499 -319,494 ; -319,494 319,494 ; -279.5,-419 -269.5,-424 -269.5,-414 -279.5,-419 ; -279.5,-419 279.5,-419 ; 279.5,-419 269.5,-424 269.5,-414 279.5,-419 ; 289,419 279,414 279,424 289,419 ; 319,419 329,414 329,424 319,419 ; 319,494 309,489 309,499 319,494 ; 419,216.54 424,206.54 414,206.54 419,216.54 ; 419,236.22 424,246.22 414,246.22 419,236.22 ; 494,-319 499,-309 489,-309 494,-319 ; 494,-319 494,319 ; 494,319 499,309 489,309 494,319
  text "0.638in/16.205mm" at 514,-12.5 h25
  text "0.559in/14.199mm" at -639,-12.5 h25
  text "0.559in/14.199mm" at -100,-464 h25
  text "0.638in/16.205mm" at -100,514 h25
  text "0.03in/0.762mm" at 216.5,439 h25
  text "0.02in/0.5mm" at 439,213.88 h25
Mechanical 13:
  drawing of 405 lines, arcs and shapes, not listed
  text "*" at -277,221.06 h50
Mechanical 15:
  region: -250.72,-289.5 -289.5,-289.5 -289.5,-250.72 -343,-250.72 -343,250.72 -289.5,250.72 -289.5,289.5 -250.72,289.5 -250.72,343 250.72,343 250.72,289.5 289.5,289.5 289.5,250.72 343,250.72 343,-250.72 289.5,-250.72 289.5,-289.5 250.72,-289.5 250.72,-343 -250.72,-343
  lines w6: -343,-250.72 -343,250.72 -289.5,250.72 -289.5,289.5 -250.72,289.5 -250.72,343 250.72,343 250.72,289.5 289.5,289.5 289.5,250.72 343,250.72 343,-250.72 289.5,-250.72 289.5,-289.5 250.72,-289.5 250.72,-343 -250.72,-343 -250.72,-289.5 -289.5,-289.5 -289.5,-250.72 -343,-250.72
3D body "LQFP-100.step": height 63.11, standoff 0, extent -319.01,-319.01 319.02,319.02
3D body: height 10, standoff 0, extent 0,0 10,10

## LQFP_100_L [mil]
pads (100):
  rect 46x12 smd paste+0 mask+0: 1(-302,236.22) 2(-302,216.54) 3(-302,196.85) 4(-302,177.17) 5(-302,157.48) 6(-302,137.8) 7(-302,118.11) 8(-302,98.43) 9(-302,78.74) 10(-302,59.06) 11(-302,39.37) 12(-302,19.69) 13(-302,0) 14(-302,-19.68) 15(-302,-39.37) 16(-302,-59.06) 17(-302,-78.74) 18(-302,-98.43) 19(-302,-118.11) 20(-302,-137.8) 21(-302,-157.48) 22(-302,-177.17) 23(-302,-196.85) 24(-302,-216.54) 25(-302,-236.22) 51(302,-236.22) 52(302,-216.54) 53(302,-196.85) 54(302,-177.17) 55(302,-157.48) 56(302,-137.8) 57(302,-118.11) 58(302,-98.43) 59(302,-78.74) 60(302,-59.06) 61(302,-39.37) 62(302,-19.68) 63(302,0) 64(302,19.68) 65(302,39.37) 66(302,59.06) 67(302,78.74) 68(302,98.43) 69(302,118.11) 70(302,137.8) 71(302,157.48) 72(302,177.17) 73(302,196.85) 74(302,216.54) 75(302,236.22)
  rect 12x46 smd paste+0 mask+0: 26(-236.22,-302) 27(-216.54,-302) 28(-196.85,-302) 29(-177.17,-302) 30(-157.48,-302) 31(-137.8,-302) 32(-118.11,-302) 33(-98.43,-302) 34(-78.74,-302) 35(-59.06,-302) 36(-39.37,-302) 37(-19.68,-302) 38(0,-302) 39(19.68,-302) 40(39.37,-302) 41(59.06,-302) 42(78.74,-302) 43(98.43,-302) 44(118.11,-302) 45(137.8,-302) 46(157.48,-302) 47(177.17,-302) 48(196.85,-302) 49(216.54,-302) 50(236.22,-302) 76(236.22,302) 77(216.54,302) 78(196.85,302) 79(177.17,302) 80(157.48,302) 81(137.8,302) 82(118.11,302) 83(98.43,302) 84(78.74,302) 85(59.06,302) 86(39.37,302) 87(19.68,302) 88(0,302) 89(-19.68,302) 90(-39.37,302) 91(-59.06,302) 92(-78.74,302) 93(-98.43,302) 94(-118.11,302) 95(-137.8,302) 96(-157.48,302) 97(-177.17,302) 98(-196.85,302) 99(-216.54,302) 100(-236.22,302)
Top Overlay:
  region: -228.72,335 -243.72,335 -243.72,345 -228.72,345
  region: -31.87,335 -46.87,335 -46.87,345 -31.87,345
  region: 164.98,335 149.98,335 149.98,345 164.98,345
  region: 335,145.3 345,145.3 345,130.3 335,130.3
  region: 335,-51.56 345,-51.56 345,-66.56 335,-66.56
  region: 243.72,-335 228.72,-335 228.72,-345 243.72,-345
  region: 46.87,-335 31.87,-335 31.87,-345 46.87,-345
  region: -149.98,-335 -164.98,-335 -164.98,-345 -149.98,-345
  region: -335,-130.3 -345,-130.3 -345,-145.3 -335,-145.3
  region: -335,66.56 -345,66.56 -345,51.56 -335,51.56
  lines w6: -284.5,-252.82 -284.5,-284.5 -252.82,-284.5 ; -284.5,252.82 -284.5,284.5 -252.82,284.5 ; 252.82,-284.5 284.5,-284.5 284.5,-252.82 ; 252.82,284.5 284.5,284.5 284.5,252.82
  text "*" at -362.5,236.06 h50
Mechanical 7:
  lines w1: -432,-279.5 -236.22,-279.5 ; -432,279.5 -236.22,279.5 ; -319,236.22 -319,507 ; -279.5,-432 -279.5,-236.22 ; 236.22,-319 507,-319 ; 236.22,319 507,319 ; 239,417 289,417 ; 279.5,-432 279.5,-236.22 ; 289,236.22 289,432 ; 302,216.54 432,216.54 ; 302,236.22 432,236.22 ; 319,432 319,236.22 319,507 ; 369,417 319,417 ; 417,166.54 417,216.54 ; 417,286.22 417,236.22 ; -417,-279.5 -412,-269.5 -422,-269.5 -417,-279.5 ; -417,-279.5 -417,279.5 ; -417,279.5 -412,269.5 -422,269.5 -417,279.5 ; -319,492 -309,487 -309,497 -319,492 ; -319,492 319,492 ; -279.5,-417 -269.5,-422 -269.5,-412 -279.5,-417 ; -279.5,-417 279.5,-417 ; 279.5,-417 269.5,-422 269.5,-412 279.5,-417 ; 289,417 279,412 279,422 289,417 ; 319,417 329,412 329,422 319,417 ; 319,492 309,487 309,497 319,492 ; 417,216.54 422,206.54 412,206.54 417,216.54 ; 417,236.22 422,246.22 412,246.22 417,236.22 ; 492,-319 497,-309 487,-309 492,-319 ; 492,-319 492,319 ; 492,319 497,309 487,309 492,319
  text "0.638in/16.205mm" at 512,-12.5 h25
  text "0.559in/14.199mm" at -637,-12.5 h25
  text "0.559in/14.199mm" at -100,-462 h25
  text "0.638in/16.205mm" at -100,512 h25
  text "0.03in/0.762mm" at 216.5,437 h25
  text "0.02in/0.5mm" at 437,213.88 h25
Mechanical 13:
  drawing of 405 lines, arcs and shapes, not listed
  text "*" at -277,221.06 h50
Mechanical 15:
  region: -243.72,-283.5 -283.5,-283.5 -283.5,-243.72 -329,-243.72 -329,243.72 -283.5,243.72 -283.5,283.5 -243.72,283.5 -243.72,329 243.72,329 243.72,283.5 283.5,283.5 283.5,243.72 329,243.72 329,-243.72 283.5,-243.72 283.5,-283.5 243.72,-283.5 243.72,-329 -243.72,-329
  lines w6: -329,-243.72 -329,243.72 -283.5,243.72 -283.5,283.5 -243.72,283.5 -243.72,329 243.72,329 243.72,283.5 283.5,283.5 283.5,243.72 329,243.72 329,-243.72 283.5,-243.72 283.5,-283.5 243.72,-283.5 243.72,-329 -243.72,-329 -243.72,-283.5 -283.5,-283.5 -283.5,-243.72 -329,-243.72
3D body: height 10, standoff 0, extent 0,0 10,10
3D body "LQFP-100-L.step": height 63.11, standoff 0, extent -319.01,-319.01 319.02,319.02